# Altium footprint library Iris.PcbLib: 90 footprints (part 2 of 6)
Each footprint in its own frame and in the unit in brackets; x right, y up, seen from the top. Pads: shape width x height; smd on the part's side, far side on the other; paste and mask are expansions set on the pad; w line width, h text height; cw(c..) or ccw(c..) is an arc to the next point about the centre after c.
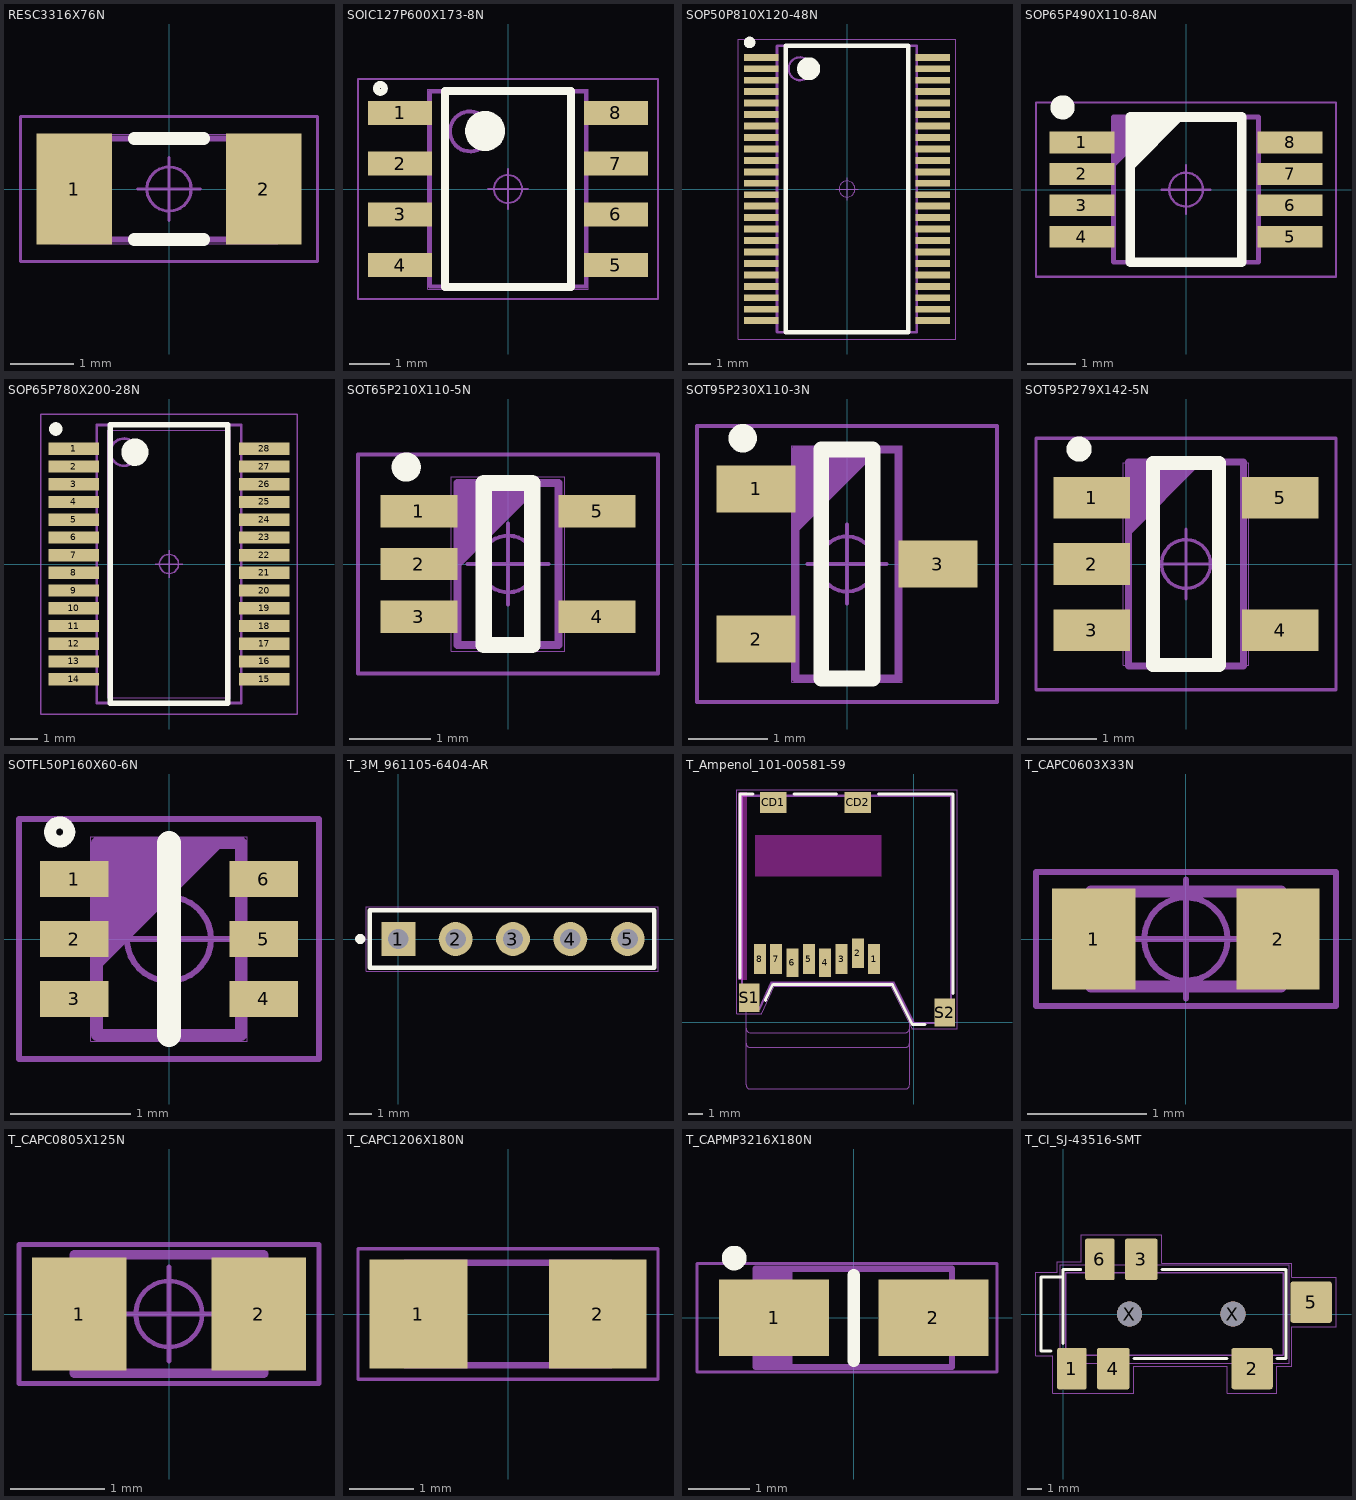
[diagram p1: the footprints below, top view; thin cyan lines are the x and y axes]

## RESC3316X76N [mm]
height 0.6
pads (2):
  rect 1.2x1.75 smd: 1(-1.5,0) 2(1.5,0)
Top Overlay:
  lines w0.2: -0.55,-0.8 0.55,-0.8 ; -0.55,0.8 0.55,0.8
Mechanical 1:
  circle w0.05: c0,0 r0.35
  lines w0.05: -0.5,0 0.5,0 ; 0,-0.5 0,0.5 ; -2.35,-1.15 -2.35,1.15 2.35,1.15 2.35,-1.15 -2.35,-1.15
Mechanical 2:
  lines w0.001: -1.725,-0.865 -1.725,0.865 1.725,0.865 1.725,-0.865 -1.725,-0.865
Mechanical 3:
  lines w0.1: -1.63,-0.8 -1.63,0.8 1.63,0.8 1.63,-0.8 -1.63,-0.8
3D body: height 0.6, standoff 0, extent -1.725,-0.865 1.725,0.865

## SOIC127P600X173-8N [mm]
height 1.75
pads (8):
  rect 1.6x0.6 smd: 1(-2.7,1.905) 2(-2.7,0.635) 3(-2.7,-0.635) 4(-2.7,-1.905) 5(2.7,-1.905) 6(2.7,-0.635) 7(2.7,0.635) 8(2.7,1.905)
Top Overlay:
  circle w0.17: c-3.191,2.515 r0.1
  circle w0.5: c-0.575,1.45 r0.25
  lines w0.2: -1.575,-2.45 -1.575,2.45 1.575,2.45 1.575,-2.45 -1.575,-2.45
Mechanical 1:
  circle w0.05: c0,0 r0.35
  lines w0.05: -0.5,0 0.5,0 ; 0,-0.5 0,0.5 ; -3.75,-2.75 -3.75,2.75 3.75,2.75 3.75,-2.75 -3.75,-2.75
Mechanical 2:
  lines w0.001: -2,-2.5 -2,2.5 2,2.5 2,-2.5 -2,-2.5
Mechanical 3:
  circle w0.1: c-0.95,1.44 r0.5
  lines w0.1: -1.95,-2.44 -1.95,2.44 1.95,2.44 1.95,-2.44 -1.95,-2.44
3D body "User Library-SOIC127P500X620X175-8.STEP": height 1.75, standoff 0, extent -3.115,-2.5 3.115,2.5

## SOP50P810X120-48N [mm]
height 1.1
pads (48):
  rect 1.5x0.3 smd: 1(-3.75,5.75) 2(-3.75,5.25) 3(-3.75,4.75) 4(-3.75,4.25) 5(-3.75,3.75) 6(-3.75,3.25) 7(-3.75,2.75) 8(-3.75,2.25) 9(-3.75,1.75) 10(-3.75,1.25) 11(-3.75,0.75) 12(-3.75,0.25) 13(-3.75,-0.25) 14(-3.75,-0.75) 15(-3.75,-1.25) 16(-3.75,-1.75) 17(-3.75,-2.25) 18(-3.75,-2.75) 19(-3.75,-3.25) 20(-3.75,-3.75) 21(-3.75,-4.25) 22(-3.75,-4.75) 23(-3.75,-5.25) 24(-3.75,-5.75) 25(3.75,-5.75) 26(3.75,-5.25) 27(3.75,-4.75) 28(3.75,-4.25) 29(3.75,-3.75) 30(3.75,-3.25) 31(3.75,-2.75) 32(3.75,-2.25) 33(3.75,-1.75) 34(3.75,-1.25) 35(3.75,-0.75) 36(3.75,-0.25) 37(3.75,0.25) 38(3.75,0.75) 39(3.75,1.25) 40(3.75,1.75) 41(3.75,2.25) 42(3.75,2.75) 43(3.75,3.25) 44(3.75,3.75) 45(3.75,4.25) 46(3.75,4.75) 47(3.75,5.25) 48(3.75,5.75)
Top Overlay:
  circle w0.25: c-4.25,6.4 r0.125
  circle w0.5: c-1.675,5.25 r0.25
  lines w0.2: -2.675,-6.25 -2.675,6.25 2.675,6.25 2.675,-6.25 -2.675,-6.25
Mechanical 1:
  circle w0.05: c0,0 r0.35
  lines w0.05: -0.5,0 0.5,0 ; 0,-0.5 0,0.5 ; -4.75,-6.55 -4.75,6.55 4.75,6.55 4.75,-6.55 -4.75,-6.55
Mechanical 2:
  lines w0.001: -3.1,-6.25 -3.1,6.25 3.1,6.25 3.1,-6.25 -3.1,-6.25
Mechanical 3:
  circle w0.1: c-2.05,5.25 r0.5
  lines w0.1: -3.05,-6.25 -3.05,6.25 3.05,6.25 3.05,-6.25 -3.05,-6.25
3D body "User Library-TSSOP-48.step": height 1.1, standoff 0, extent -4.05,-6.25 4.05,6.25

## SOP65P490X110-8AN [mm] "MSOP-8"
height 1.1
pads (8):
  rect 1.35x0.45 smd: 1(-2.15,0.975) 2(-2.15,0.325) 3(-2.15,-0.325) 4(-2.15,-0.975) 5(2.15,-0.975) 6(2.15,-0.325) 7(2.15,0.325) 8(2.15,0.975)
Top Overlay:
  circle w0.25: c-2.55,1.7 r0.125
  lines w0.2: -1.15,0.5 -0.15,1.5 ; -1.15,0.7 -0.35,1.5 ; -1.15,0.9 -0.55,1.5 ; -1.15,1.1 -0.75,1.5 ; -1.15,1.3 -0.95,1.5 ; -1.15,-1.5 -1.15,1.5 1.15,1.5 1.15,-1.5 -1.15,-1.5
Mechanical 1:
  circle w0.05: c0,0 r0.35
  lines w0.001: -1.5,-1.5 1.5,-1.5
  lines w0.05: -0.5,0 0.5,0 ; 0,-0.5 0,0.5 ; -3.1,-1.8 -3.1,1.8 3.1,1.8 3.1,-1.8 -3.1,-1.8
Mechanical 2:
  lines w0.001: -1.5,-1.5 -1.5,1.5 1.5,1.5 1.5,-1.5
Mechanical 3:
  lines w0.1: -1.5,0.5 -0.5,1.5 ; -1.5,0.6 -0.6,1.5 ; -1.5,0.7 -0.7,1.5 ; -1.5,0.8 -0.8,1.5 ; -1.5,0.9 -0.9,1.5 ; -1.5,1 -1,1.5 ; -1.5,1.1 -1.1,1.5 ; -1.5,1.2 -1.2,1.5 ; -1.5,1.3 -1.3,1.5 ; -1.5,1.4 -1.4,1.5 ; -1.5,-1.5 1.5,-1.5 1.5,1.5 -1.5,1.5 -1.5,-1.5
3D body "User Library-msop-8.step": height 1.15, standoff 0, extent -2.45,-1.5 2.45,1.5

## SOP65P780X200-28N [mm]
height 2
pads (28):
  rect 1.85x0.45 smd: 1(-3.5,4.225) 2(-3.5,3.575) 3(-3.5,2.925) 4(-3.5,2.275) 5(-3.5,1.625) 6(-3.5,0.975) 7(-3.5,0.325) 8(-3.5,-0.325) 9(-3.5,-0.975) 10(-3.5,-1.625) 11(-3.5,-2.275) 12(-3.5,-2.925) 13(-3.5,-3.575) 14(-3.5,-4.225) 15(3.5,-4.225) 16(3.5,-3.575) 17(3.5,-2.925) 18(3.5,-2.275) 19(3.5,-1.625) 20(3.5,-0.975) 21(3.5,-0.325) 22(3.5,0.325) 23(3.5,0.975) 24(3.5,1.625) 25(3.5,2.275) 26(3.5,2.925) 27(3.5,3.575) 28(3.5,4.225)
Top Overlay:
  circle w0.5: c-1.25,4.1 r0.25
  circle w0.25: c-4.15,4.95 r0.125
  lines w0.2: -2.159,-5.1 2.159,-5.1 2.159,5.1 -2.159,5.1 -2.159,-5.1
Mechanical 1:
  circle w0.05: c0,0 r0.35
  lines w0.05: -0.5,0 0.5,0 ; 0,-0.5 0,0.5 ; -4.7,-5.5 4.7,-5.5 4.7,5.5 -4.7,5.5 -4.7,-5.5
Mechanical 2:
  lines w0.001: -2.25,-4.9 2.25,-4.9 2.25,4.9 -2.25,4.9 -2.25,-4.9
Mechanical 3:
  circle w0.1: c-1.65,4.1 r0.5
  lines w0.1: -2.65,-5.1 2.65,-5.1 2.65,5.1 -2.65,5.1 -2.65,-5.1
3D body "User Library-TSSOP-28W.STEP": height 1.2, standoff 0, extent -4.05,-4.85 4.05,4.85

## SOT65P210X110-5N [mm]
height 1.1
pads (5):
  rect 0.95x0.4 smd: 1(-1.1,0.65) 2(-1.1,0) 3(-1.1,-0.65) 4(1.1,-0.65) 5(1.1,0.65)
Top Overlay:
  circle w0.2: c-1.255,1.195 r0.08
  lines w0.2: -0.3,-1 0.3,-1 0.3,1 -0.3,1 -0.3,-1
Mechanical 1:
  circle w0.05: c0,0 r0.35
  lines w0.05: -0.5,0 0.5,0 ; 0,-0.5 0,0.5 ; -1.85,-1.35 1.85,-1.35 1.85,1.35 -1.85,1.35 -1.85,-1.35
Mechanical 2:
  lines w0.001: -0.7,-1.075 0.7,-1.075 0.7,1.075 -0.7,1.075 -0.7,-1.075
Mechanical 3:
  lines w0.1: -0.625,0 0.375,1 ; -0.625,0.1 0.275,1 ; -0.625,0.2 0.175,1 ; -0.625,0.3 0.075,1 ; -0.625,0.4 -0.025,1 ; -0.625,0.5 -0.125,1 ; -0.625,0.6 -0.225,1 ; -0.625,0.7 -0.325,1 ; -0.625,0.8 -0.425,1 ; -0.625,0.9 -0.525,1 ; -0.625,-1 0.625,-1 0.625,1 -0.625,1 -0.625,-1
3D body "User Library-SOT-70-5.step": height 1.09, standoff -0.01, extent -1.193,-1.075 1.194,1.075

## SOT95P230X110-3N [mm]
height 1.12
pads (3):
  rect 1x0.6 smd: 1(-1.15,0.95) 2(-1.15,-0.95) 3(1.15,0)
Top Overlay:
  circle w0.2: c-1.321,1.593 r0.08
  lines w0.2: -0.325,-1.45 0.325,-1.45 0.325,1.45 -0.325,1.45 -0.325,-1.45
Mechanical 1:
  circle w0.05: c0,0 r0.35
  lines w0.05: -0.5,0 0.5,0 ; 0,-0.5 0,0.5 ; -1.9,-1.75 1.9,-1.75 1.9,1.75 -1.9,1.75 -1.9,-1.75
Mechanical 2:
  lines w0.001: -0.7,-1.5 0.7,-1.5 0.7,1.5 -0.7,1.5 -0.7,-1.5
Mechanical 3:
  lines w0.1: -0.65,0.45 0.35,1.45 ; -0.65,0.55 0.25,1.45 ; -0.65,0.65 0.15,1.45 ; -0.65,0.75 0.05,1.45 ; -0.65,0.85 -0.05,1.45 ; -0.65,0.95 -0.15,1.45 ; -0.65,1.05 -0.25,1.45 ; -0.65,1.15 -0.35,1.45 ; -0.65,1.25 -0.45,1.45 ; -0.65,1.35 -0.55,1.45 ; -0.65,-1.45 0.65,-1.45 0.65,1.45 -0.65,1.45 -0.65,-1.45
3D body "CircuitWorks-SOT-23.step": height 1.09, standoff 0, extent -1.25,-1.5 1.25,1.5

## SOT95P279X142-5N [mm]
height 1.1
pads (5):
  rect 1.1x0.6 smd: 1(-1.35,0.95) 2(-1.35,0) 3(-1.35,-0.95) 4(1.35,-0.95) 5(1.35,0.95)
Top Overlay:
  circle w0.2: c-1.533,1.646 r0.08
  lines w0.2: -0.475,-1.45 -0.475,1.45 0.475,1.45 0.475,-1.45 -0.475,-1.45
Mechanical 1:
  circle w0.05: c0,0 r0.35
  lines w0.05: -0.5,0 0.5,0 ; 0,-0.5 0,0.5 ; -2.15,-1.8 -2.15,1.8 2.15,1.8 2.15,-1.8 -2.15,-1.8
Mechanical 2:
  lines w0.001: -0.9,-1.45 -0.9,1.45 0.9,1.45 0.9,-1.45 -0.9,-1.45
Mechanical 3:
  lines w0.1: -0.825,0.46 0.175,1.46 ; -0.825,0.56 0.075,1.46 ; -0.825,0.66 -0.025,1.46 ; -0.825,0.76 -0.125,1.46 ; -0.825,0.86 -0.225,1.46 ; -0.825,0.96 -0.325,1.46 ; -0.825,1.06 -0.425,1.46 ; -0.825,1.16 -0.525,1.46 ; -0.825,1.26 -0.625,1.46 ; -0.825,1.36 -0.725,1.46 ; -0.825,-1.46 -0.825,1.46 0.825,1.46 0.825,-1.46 -0.825,-1.46
3D body "User Library-SOT23-5-2.step": height 1.45, standoff 0, extent -1.4,-1.45 1.4,1.45

## SOTFL50P160X60-6N [mm]
height 0.6
pads (6):
  rect 0.57x0.3 smd: 1(-0.79,0.5) 2(-0.79,0) 3(-0.79,-0.5) 4(0.79,-0.5) 5(0.79,0) 6(0.79,0.5)
Top Overlay:
  circle w0.1: c-0.911,0.892 r0.08
  lines w0.2: 0,-0.8 0,0.8
Mechanical 1:
  circle w0.05: c0,0 r0.35
  lines w0.05: -0.5,0 0.5,0 ; 0,-0.5 0,0.5 ; -1.25,-1 1.25,-1 1.25,1 -1.25,1 -1.25,-1
Mechanical 2:
  lines w0.001: -0.65,-0.85 0.65,-0.85 0.65,0.85 -0.65,0.85 -0.65,-0.85
Mechanical 3:
  lines w0.1: -0.6,-0.2 0.4,0.8 ; -0.6,-0.1 0.3,0.8 ; -0.6,0 0.2,0.8 ; -0.6,0.1 0.1,0.8 ; -0.6,0.2 0,0.8 ; -0.6,0.3 -0.1,0.8 ; -0.6,0.4 -0.2,0.8 ; -0.6,0.5 -0.3,0.8 ; -0.6,0.6 -0.4,0.8 ; -0.6,0.7 -0.5,0.8 ; -0.6,-0.8 0.6,-0.8 0.6,0.8 -0.6,0.8 -0.6,-0.8
3D body: height 0.6, standoff 0, extent -0.65,-0.85 0.65,0.85

## T_3M_961105-6404-AR [mm] "Connector; Header; 35 Position"
height 8.4
pads (5):
  rect 1.5x1.5 hole 0.9: 1(0,0)
  round 1.5 hole 0.9: 2(2.54,0) 3(5.08,0) 4(7.62,0) 5(10.16,0)
Top Overlay:
  circle w0.25: c-1.687,0 r0.1
  lines w0.2: -1.27,-1.27 -1.27,1.27 11.344,1.27 11.344,-1.27 -1.27,-1.27
Mechanical 1:
  lines w0.05: -1.43,-1.43 11.504,-1.43 11.504,1.43 -1.43,1.43 -1.43,-1.43
Mechanical 2:
  lines w0.001: -1.27,-1.27 -1.27,1.27 11.344,1.27 11.344,-1.27 -1.27,-1.27
Mechanical 3:
  lines w0.1: -1.27,-1.27 -1.27,1.27 11.344,1.27 11.344,-1.27 -1.27,-1.27
3D body "Samtec-TSW-105-07-G-S, Jumper with 5 pins, male.step": height 8.4, standoff -2.52, extent -1.27,-1.27 11.43,1.27

## T_Ampenol_101-00581-59 [mm] "MicroSD Holder top-loading type"
height 1.8
pads (12):
  rect 0.8x2 smd: 1(-2.67,4.25) 2(-3.77,4.65) 3(-4.87,4.25) 5(-7.07,4.25) 7(-9.27,4.25) 8(-10.37,4.25)
  rect 0.8x1.9 smd: 4(-5.97,4) 6(-8.17,4)
  rect 1.8x1.4 smd: CD1(-9.47,14.8) CD2(-3.77,14.8)
  rect 1.4x1.9 smd: S1(-11.08,1.65) S2(2.08,0.65)
Top Overlay:
  lines w0.2: -11.697,2.96 -11.697,15.366 -10.839,15.366 ; -9.998,1.461 -9.496,2.549 -1.448,2.549 -0.105,-0.167 0.753,-0.167 ; -8.055,15.366 -5.197,15.366 ; -2.39,15.366 2.636,15.366 2.636,1.928
Keep-Out Layer:
  rectangle: -11.83,2.854 -11.23,15.5
  rectangle: -10.68,9.8 -2.18,12.6
Mechanical 1:
  lines w0.05: -11.916,0.564 -11.916,15.636 2.916,15.636 2.916,-0.436 -0.135,-0.436 -1.54,2.407 -9.403,2.407 -10.253,0.564 -11.916,0.564
Mechanical 2:
  lines w0.001: -11.29,-1.425 ccw(c-11.015,-1.425) -11.015,-1.7 -0.565,-1.7 ccw(c-0.565,-1.425) -0.29,-1.425 ; -11.29,-0.428 -11.29,-4.225 ccw(c-11.015,-4.225) -11.015,-4.5 -0.565,-4.5 ccw(c-0.565,-4.225) -0.29,-4.225 -0.29,-0.425 ; -11.29,0.95 -11.29,-0.425 ccw(c-11.015,-0.425) -11.015,-0.7 -0.565,-0.7 ccw(c-0.565,-0.425) -0.29,-0.425 ; -0.29,0.586 -0.29,-0.425 ; -11.53,0.95 -10.424,0.95 -9.608,2.721 -1.346,2.721 0,0 2.47,0 2.47,15.2 -11.53,15.2 -11.53,0.95
Mechanical 3:
  lines w0.1: -10.38,0.876 -11.596,0.876 -11.596,15.266 2.529,15.266 ; -10.379,0.878 -9.563,2.649 ; -9.56,2.649 -1.384,2.649 ; -1.383,2.649 -0.041,-0.066 ; -0.038,-0.068 2.538,-0.068 ; 2.535,-0.045 2.535,15.265 2.529,15.265 ; 2.529,15.265 2.529,15.266
3D body: height 1.72, standoff 0, extent -11.53,0 2.47,15.2

## T_CAPC0603X33N [mm] "Ceramic Capacitor 0603 (1608 metric), max height 0.9mm"
height 0.9
pads (2):
  rect 0.7x0.85 smd: 1(-0.775,0) 2(0.775,0)
Mechanical 1:
  circle w0.05: c0,0 r0.35
  lines w0.05: -0.5,0 0.5,0 ; 0,-0.5 0,0.5 ; -1.261,-0.563 1.262,-0.563 1.262,0.563 -1.261,0.563 -1.261,-0.563
Mechanical 2:
  lines w0.001: -0.8,-0.4 0.8,-0.4 0.8,0.4 -0.8,0.4 -0.8,-0.4
Mechanical 3:
  lines w0.1: -0.8,-0.4 0.8,-0.4 0.8,0.4 -0.8,0.4 -0.8,-0.4
3D body "User Library-CAPC1608X09.step": height 0.9, standoff 0, extent -0.8,-0.4 0.8,0.4

## T_CAPC0805X125N [mm] "Ceramic Capacitor 0805 (2012 metric), max height 1.25mm"
height 1.25
pads (2):
  rect 1x1.2 smd: 1(-0.95,0) 2(0.95,0)
Mechanical 1:
  circle w0.05: c0,0 r0.35
  lines w0.05: -0.5,0 0.5,0 ; 0,-0.5 0,0.5 ; -1.586,-0.736 -1.586,0.736 1.586,0.736 1.586,-0.736 -1.586,-0.736
Mechanical 2:
  lines w0.001: -1,-0.625 1,-0.625 1,0.625 -1,0.625 -1,-0.625
Mechanical 3:
  lines w0.1: -1,-0.625 -1,0.625 1,0.625 1,-0.625 -1,-0.625
3D body "User Library-CAPC2013X10.STEP": height 1, standoff 0, extent -1,-0.625 1,0.625

## T_CAPC1206X180N [mm] "Ceramic Capacitor 1206 (3216 metric), max height 1.8mm"
height 1.8
pads (2):
  rect 1.524x1.7 smd: 1(-1.397,0) 2(1.397,0)
Mechanical 1:
  lines w0.05: -2.337,-1.016 -2.337,1.016 2.336,1.016 2.336,-1.016 -2.337,-1.016
Mechanical 2:
  lines w0.01: -1.6,-0.8 1.6,-0.8 1.6,0.8 -1.6,0.8 -1.6,-0.8
Mechanical 3:
  lines w0.1: -1.6,-0.8 -1.6,0.8 1.6,0.8 1.6,-0.8 -1.6,-0.8
3D body "capacitor 1206.step": height 1, standoff 0, extent -1.6,-0.8 1.6,0.8

## T_CAPMP3216X180N [mm]
height 1.6
pads (2):
  rect 1.8x1.25 smd: 1(-1.3,0) 2(1.3,0)
Top Overlay:
  circle w0.3: c-1.95,0.975 r0.05
  lines w0.2: 0,-0.699 0,0.699
Mechanical 1:
  lines w0.05: -2.556,-0.886 -2.556,0.886 2.336,0.886 2.336,-0.886 -2.556,-0.886
Mechanical 2:
  lines w0.001: -1.6,-0.8 1.6,-0.8 1.6,0.8 -1.6,0.8 -1.6,-0.8
Mechanical 3:
  lines w0.1: -1.55,-0.8 -1.55,0.8 ; -1.45,-0.8 -1.45,0.8 ; -1.35,-0.8 -1.35,0.8 ; -1.25,-0.8 -1.25,0.8 ; -1.15,-0.8 -1.15,0.8 ; -1.05,-0.8 -1.05,0.8 ; -1.6,-0.8 1.6,-0.8 1.6,0.8 -1.6,0.8 -1.6,-0.8
3D body: height 1.6, standoff 0, extent -1,-0.8 1.6,0.8
3D body: height 1.6, standoff 0, extent -1.6,-0.8 -1,0.8

## T_CI_SJ-43516-SMT [mm] "STEREO_3.5mm AUDIO JACK  CUI"
height 5
pads (8):
  rrect12% 2x2.8 smd: 1(0.6,-3.7) 6(2.5,3.7)
  rrect12% 2.8x2.8 smd: 2(12.8,-3.7) 5(16.8,0.8)
  rrect12% 2.2x2.8 smd: 3(5.3,3.7) 4(3.4,-3.7)
  round 1.7 hole 1.7 unplated: X(4.5,0) X(11.5,0)
Top Overlay:
  lines w0.2: -0.8,-2.5 -1.5,-2.5 -1.5,2.5 0,2.5 ; 0,-2 0,3 1.2,3 ; 4.8,-3 11.1,-3 ; 6.7,3 15.1,3 15.1,-3 14.5,-3
Mechanical 1:
  lines w0.05: -1.83,-2.83 -0.68,-2.83 -0.68,-5.38 4.78,-5.38 4.78,-3.53 11.12,-3.53 11.12,-5.38 14.48,-5.38 14.48,-3.53 15.48,-3.53 15.48,-0.87 18.48,-0.87 18.48,2.48 15.48,2.48 15.48,3.45 6.68,3.45 6.68,5.38 1.22,5.38 1.22,3.53 -0.39,3.53 -0.39,2.83 -1.83,2.83 -1.83,-2.83
Mechanical 2:
  lines w0.001: -0.2,-3.35 15.3,-3.35 15.3,3.35 -0.2,3.35 -0.2,-3.35
Mechanical 3:
  lines w0.1: 0.2,-2.8 0.2,2.8 14.9,2.8 14.9,-2.8 0.2,-2.8
3D body "SJ-43516-SMT.stp": height 5.12, standoff -0.68, extent -1.7,-4.5 17.5,4.5